# Altium integrated library Samtec 2 mm Pitch Terminal Strips.IntLib: 623 symbols (part 2 of 5) (continued)
## MTMM-112-10-L-D-420
designator P?
Modified Through-Hole Header, Vertical, -55 to 125 degC, 2 mm Pitch, 24-Pin, Male, RoHS; Manufacturer: Samtec; PartNumber: MTMM-112-10-L-D-420; Pitch: 2 mm; DatasheetVersion: F-214; PackageVersion: AE, 12/1993; PackageReference: MTMM-112-10-X-D-420; PackageDescription: 2mm Terminal Strip Assembly; Orientation: Vertical; RoHS: True; Temperature Range: -55 to 125 degC; Mounting Technology: Through-hole; ComponentLink1Description: Manufacturer URL; ComponentLink1URL: http://www.samtec.com; ComponentLink2Description: Datasheet; ComponentLink2URL: http://d2a072wq521u33.cloudfront.net/catalog_english//MTMM_TH.PDF; ComponentLink3Description: Package Specification; ComponentLink3URL: http://www.samtec.com/documents/webfiles/cpdf/MTMM-1XX-XX-XX-X-XXX-XX-XXX-MKT.pdf
footprint SMTC-MTMM-112-10-X-D-420 (Terminal Strip Assembly, 2x12 Pins, Vertical, 2mm Pitch, Male)
pins: 1, 2, 3, 4, 5, 6, 7, 8, 9, 10, 11, 12, 13, 14, 15, 16, 17, 18, 19, 20, 21, 22, 23, 24

## MTMM-112-10-T-D-420
designator P?
Modified Through-Hole Header, Vertical, -55 to 105 degC, 2 mm Pitch, 24-Pin, Male, RoHS; Manufacturer: Samtec; PartNumber: MTMM-112-10-T-D-420; Pitch: 2 mm; DatasheetVersion: F-214; PackageVersion: AE, 12/1993; PackageReference: MTMM-112-10-X-D-420; PackageDescription: 2mm Terminal Strip Assembly; Orientation: Vertical; RoHS: True; Temperature Range: -55 to 105 degC; Mounting Technology: Through-hole; ComponentLink1Description: Manufacturer URL; ComponentLink1URL: http://www.samtec.com; ComponentLink2Description: Datasheet; ComponentLink2URL: http://d2a072wq521u33.cloudfront.net/catalog_english//MTMM_TH.PDF; ComponentLink3Description: Package Specification; ComponentLink3URL: http://www.samtec.com/documents/webfiles/cpdf/MTMM-1XX-XX-XX-X-XXX-XX-XXX-MKT.pdf
footprint SMTC-MTMM-112-10-X-D-420 (Terminal Strip Assembly, 2x12 Pins, Vertical, 2mm Pitch, Male)
pins: 1, 2, 3, 4, 5, 6, 7, 8, 9, 10, 11, 12, 13, 14, 15, 16, 17, 18, 19, 20, 21, 22, 23, 24

## MTMM-113-10-F-D-420
designator P?
Modified Through-Hole Header, Vertical, -55 to 125 degC, 2 mm Pitch, 26-Pin, Male, RoHS; Manufacturer: Samtec; PartNumber: MTMM-113-10-F-D-420; Pitch: 2 mm; DatasheetVersion: F-214; PackageVersion: AE, 12/1993; PackageReference: MTMM-113-10-X-D-420; PackageDescription: 2mm Terminal Strip Assembly; Orientation: Vertical; RoHS: True; Temperature Range: -55 to 125 degC; Mounting Technology: Through-hole; ComponentLink1Description: Manufacturer URL; ComponentLink1URL: http://www.samtec.com; ComponentLink2Description: Datasheet; ComponentLink2URL: http://d2a072wq521u33.cloudfront.net/catalog_english//MTMM_TH.PDF; ComponentLink3Description: Package Specification; ComponentLink3URL: http://www.samtec.com/documents/webfiles/cpdf/MTMM-1XX-XX-XX-X-XXX-XX-XXX-MKT.pdf
footprint SMTC-MTMM-113-10-X-D-420 (Terminal Strip Assembly, 2x13 Pins, Vertical, 2mm Pitch, Male)
pins: 1, 2, 3, 4, 5, 6, 7, 8, 9, 10, 11, 12, 13, 14, 15, 16, 17, 18, 19, 20, 21, 22, 23, 24, 25, 26

## MTMM-113-10-L-D-420
designator P?
Modified Through-Hole Header, Vertical, -55 to 125 degC, 2 mm Pitch, 26-Pin, Male, RoHS; Manufacturer: Samtec; PartNumber: MTMM-113-10-L-D-420; Pitch: 2 mm; DatasheetVersion: F-214; PackageVersion: AE, 12/1993; PackageReference: MTMM-113-10-X-D-420; PackageDescription: 2mm Terminal Strip Assembly; Orientation: Vertical; RoHS: True; Temperature Range: -55 to 125 degC; Mounting Technology: Through-hole; ComponentLink1Description: Manufacturer URL; ComponentLink1URL: http://www.samtec.com; ComponentLink2Description: Datasheet; ComponentLink2URL: http://d2a072wq521u33.cloudfront.net/catalog_english//MTMM_TH.PDF; ComponentLink3Description: Package Specification; ComponentLink3URL: http://www.samtec.com/documents/webfiles/cpdf/MTMM-1XX-XX-XX-X-XXX-XX-XXX-MKT.pdf
footprint SMTC-MTMM-113-10-X-D-420 (Terminal Strip Assembly, 2x13 Pins, Vertical, 2mm Pitch, Male)
pins: 1, 2, 3, 4, 5, 6, 7, 8, 9, 10, 11, 12, 13, 14, 15, 16, 17, 18, 19, 20, 21, 22, 23, 24, 25, 26

## MTMM-113-10-T-D-420
designator P?
Modified Through-Hole Header, Vertical, -55 to 105 degC, 2 mm Pitch, 26-Pin, Male, RoHS; Manufacturer: Samtec; PartNumber: MTMM-113-10-T-D-420; Pitch: 2 mm; DatasheetVersion: F-214; PackageVersion: AE, 12/1993; PackageReference: MTMM-113-10-X-D-420; PackageDescription: 2mm Terminal Strip Assembly; Orientation: Vertical; RoHS: True; Temperature Range: -55 to 105 degC; Mounting Technology: Through-hole; ComponentLink1Description: Manufacturer URL; ComponentLink1URL: http://www.samtec.com; ComponentLink2Description: Datasheet; ComponentLink2URL: http://d2a072wq521u33.cloudfront.net/catalog_english//MTMM_TH.PDF; ComponentLink3Description: Package Specification; ComponentLink3URL: http://www.samtec.com/documents/webfiles/cpdf/MTMM-1XX-XX-XX-X-XXX-XX-XXX-MKT.pdf
footprint SMTC-MTMM-113-10-X-D-420 (Terminal Strip Assembly, 2x13 Pins, Vertical, 2mm Pitch, Male)
pins: 1, 2, 3, 4, 5, 6, 7, 8, 9, 10, 11, 12, 13, 14, 15, 16, 17, 18, 19, 20, 21, 22, 23, 24, 25, 26

## MTMM-122-07-F-D-275
designator P?
Modified Through-Hole Header, Vertical, -55 to 125 degC, 2 mm Pitch, 44-Pin, Male, RoHS; Manufacturer: Samtec; PartNumber: MTMM-122-07-F-D-275; Pitch: 2 mm; DatasheetVersion: F-214; PackageVersion: AE, 12/1993; PackageReference: MTMM-122-07-X-D-275; PackageDescription: 2mm Terminal Strip Assembly; Orientation: Vertical; RoHS: True; Temperature Range: -55 to 125 degC; Mounting Technology: Through-hole; ComponentLink1Description: Manufacturer URL; ComponentLink1URL: http://www.samtec.com; ComponentLink2Description: Datasheet; ComponentLink2URL: http://d2a072wq521u33.cloudfront.net/catalog_english//MTMM_TH.PDF; ComponentLink3Description: Package Specification; ComponentLink3URL: http://www.samtec.com/documents/webfiles/cpdf/MTMM-1XX-XX-XX-X-XXX-XX-XXX-MKT.pdf
footprint SMTC-MTMM-122-07-X-D-275 (Terminal Strip Assembly, 2x22 Pins, Vertical, 2mm Pitch, Male)
pins: 1, 2, 3, 4, 5, 6, 7, 8, 9, 10, 11, 12, 13, 14, 15, 16, 17, 18, 19, 20, 21, 22, 23, 24, 25, 26, 27, 28, 29, 30, 31, 32, 33, 34, 35, 36, 37, 38, 39, 40, 41, 42, 43, 44

## MTMM-122-07-L-D-275
designator P?
Modified Through-Hole Header, Vertical, -55 to 125 degC, 2 mm Pitch, 44-Pin, Male, RoHS; Manufacturer: Samtec; PartNumber: MTMM-122-07-L-D-275; Pitch: 2 mm; DatasheetVersion: F-214; PackageVersion: AE, 12/1993; PackageReference: MTMM-122-07-X-D-275; PackageDescription: 2mm Terminal Strip Assembly; Orientation: Vertical; RoHS: True; Temperature Range: -55 to 125 degC; Mounting Technology: Through-hole; ComponentLink1Description: Manufacturer URL; ComponentLink1URL: http://www.samtec.com; ComponentLink2Description: Datasheet; ComponentLink2URL: http://d2a072wq521u33.cloudfront.net/catalog_english//MTMM_TH.PDF; ComponentLink3Description: Package Specification; ComponentLink3URL: http://www.samtec.com/documents/webfiles/cpdf/MTMM-1XX-XX-XX-X-XXX-XX-XXX-MKT.pdf
footprint SMTC-MTMM-122-07-X-D-275 (Terminal Strip Assembly, 2x22 Pins, Vertical, 2mm Pitch, Male)
pins: 1, 2, 3, 4, 5, 6, 7, 8, 9, 10, 11, 12, 13, 14, 15, 16, 17, 18, 19, 20, 21, 22, 23, 24, 25, 26, 27, 28, 29, 30, 31, 32, 33, 34, 35, 36, 37, 38, 39, 40, 41, 42, 43, 44

## MTMM-122-07-T-D-275
designator P?
Modified Through-Hole Header, Vertical, -55 to 105 degC, 2 mm Pitch, 44-Pin, Male, RoHS; Manufacturer: Samtec; PartNumber: MTMM-122-07-T-D-275; Pitch: 2 mm; DatasheetVersion: F-214; PackageVersion: AE, 12/1993; PackageReference: MTMM-122-07-X-D-275; PackageDescription: 2mm Terminal Strip Assembly; Orientation: Vertical; RoHS: True; Temperature Range: -55 to 105 degC; Mounting Technology: Through-hole; ComponentLink1Description: Manufacturer URL; ComponentLink1URL: http://www.samtec.com; ComponentLink2Description: Datasheet; ComponentLink2URL: http://d2a072wq521u33.cloudfront.net/catalog_english//MTMM_TH.PDF; ComponentLink3Description: Package Specification; ComponentLink3URL: http://www.samtec.com/documents/webfiles/cpdf/MTMM-1XX-XX-XX-X-XXX-XX-XXX-MKT.pdf
footprint SMTC-MTMM-122-07-X-D-275 (Terminal Strip Assembly, 2x22 Pins, Vertical, 2mm Pitch, Male)
pins: 1, 2, 3, 4, 5, 6, 7, 8, 9, 10, 11, 12, 13, 14, 15, 16, 17, 18, 19, 20, 21, 22, 23, 24, 25, 26, 27, 28, 29, 30, 31, 32, 33, 34, 35, 36, 37, 38, 39, 40, 41, 42, 43, 44

## MTMM-140-04-F-D-025
designator P?
Modified Through-Hole Header, Vertical, -55 to 125 degC, 2 mm Pitch, 80-Pin, Male, RoHS; Manufacturer: Samtec; PartNumber: MTMM-140-04-F-D-025; Pitch: 2 mm; DatasheetVersion: F-214; PackageVersion: AE, 12/1993; PackageReference: MTMM-140-04-X-D-025; PackageDescription: 2mm Terminal Strip Assembly; Orientation: Vertical; RoHS: True; Temperature Range: -55 to 125 degC; Mounting Technology: Through-hole; ComponentLink1Description: Manufacturer URL; ComponentLink1URL: http://www.samtec.com; ComponentLink2Description: Datasheet; ComponentLink2URL: http://d2a072wq521u33.cloudfront.net/catalog_english//MTMM_TH.PDF; ComponentLink3Description: Package Specification; ComponentLink3URL: http://www.samtec.com/documents/webfiles/cpdf/MTMM-1XX-XX-XX-X-XXX-XX-XXX-MKT.pdf
footprint SMTC-MTMM-140-04-X-D-025 (Terminal Strip Assembly, 2x40 Pins, Vertical, 2mm Pitch, Male)
pins: 1, 2, 3, 4, 5, 6, 7, 8, 9, 10, 11, 12, 13, 14, 15, 16, 17, 18, 19, 20, 21, 22, 23, 24, 25, 26, 27, 28, 29, 30, 31, 32, 33, 34, 35, 36, 37, 38, 39, 40, 41, 42, 43, 44, 45, 46, 47, 48, 49, 50, 51, 52, 53, 54, 55, 56, 57, 58, 59, 60, 61, 62, 63, 64, 65, 66, 67, 68, 69, 70, 71, 72, 73, 74, 75, 76, 77, 78, 79, 80

## MTMM-140-04-L-D-025
designator P?
Modified Through-Hole Header, Vertical, -55 to 125 degC, 2 mm Pitch, 80-Pin, Male, RoHS; Manufacturer: Samtec; PartNumber: MTMM-140-04-L-D-025; Pitch: 2 mm; DatasheetVersion: F-214; PackageVersion: AE, 12/1993; PackageReference: MTMM-140-04-X-D-025; PackageDescription: 2mm Terminal Strip Assembly; Orientation: Vertical; RoHS: True; Temperature Range: -55 to 125 degC; Mounting Technology: Through-hole; ComponentLink1Description: Manufacturer URL; ComponentLink1URL: http://www.samtec.com; ComponentLink2Description: Datasheet; ComponentLink2URL: http://d2a072wq521u33.cloudfront.net/catalog_english//MTMM_TH.PDF; ComponentLink3Description: Package Specification; ComponentLink3URL: http://www.samtec.com/documents/webfiles/cpdf/MTMM-1XX-XX-XX-X-XXX-XX-XXX-MKT.pdf
footprint SMTC-MTMM-140-04-X-D-025 (Terminal Strip Assembly, 2x40 Pins, Vertical, 2mm Pitch, Male)
pins: 1, 2, 3, 4, 5, 6, 7, 8, 9, 10, 11, 12, 13, 14, 15, 16, 17, 18, 19, 20, 21, 22, 23, 24, 25, 26, 27, 28, 29, 30, 31, 32, 33, 34, 35, 36, 37, 38, 39, 40, 41, 42, 43, 44, 45, 46, 47, 48, 49, 50, 51, 52, 53, 54, 55, 56, 57, 58, 59, 60, 61, 62, 63, 64, 65, 66, 67, 68, 69, 70, 71, 72, 73, 74, 75, 76, 77, 78, 79, 80

## MTMM-140-04-T-D-025
designator P?
Modified Through-Hole Header, Vertical, -55 to 105 degC, 2 mm Pitch, 80-Pin, Male, RoHS; Manufacturer: Samtec; PartNumber: MTMM-140-04-T-D-025; Pitch: 2 mm; DatasheetVersion: F-214; PackageVersion: AE, 12/1993; PackageReference: MTMM-140-04-X-D-025; PackageDescription: 2mm Terminal Strip Assembly; Orientation: Vertical; RoHS: True; Temperature Range: -55 to 105 degC; Mounting Technology: Through-hole; ComponentLink1Description: Manufacturer URL; ComponentLink1URL: http://www.samtec.com; ComponentLink2Description: Datasheet; ComponentLink2URL: http://d2a072wq521u33.cloudfront.net/catalog_english//MTMM_TH.PDF; ComponentLink3Description: Package Specification; ComponentLink3URL: http://www.samtec.com/documents/webfiles/cpdf/MTMM-1XX-XX-XX-X-XXX-XX-XXX-MKT.pdf
footprint SMTC-MTMM-140-04-X-D-025 (Terminal Strip Assembly, 2x40 Pins, Vertical, 2mm Pitch, Male)
pins: 1, 2, 3, 4, 5, 6, 7, 8, 9, 10, 11, 12, 13, 14, 15, 16, 17, 18, 19, 20, 21, 22, 23, 24, 25, 26, 27, 28, 29, 30, 31, 32, 33, 34, 35, 36, 37, 38, 39, 40, 41, 42, 43, 44, 45, 46, 47, 48, 49, 50, 51, 52, 53, 54, 55, 56, 57, 58, 59, 60, 61, 62, 63, 64, 65, 66, 67, 68, 69, 70, 71, 72, 73, 74, 75, 76, 77, 78, 79, 80

## PTT-102-01-L-S
designator P?
Press Fit Header, Through-hole, Vertical, -55 to 125 degC, 2 mm Pitch, 2-Pin, Male, RoHS; Manufacturer: Samtec; PartNumber: PTT-102-01-L-S; Pitch: 2 mm; DatasheetVersion: F-214; PackageVersion: C, 1/2011; PackageReference: PTT-102-01-X-S; PackageDescription: 2 mm Press Fit Terminal Strip; Orientation: Vertical; RoHS: True; Temperature Range: -55 to 125 degC; Mounting Technology: Through-hole; ComponentLink1Description: Manufacturer URL; ComponentLink1URL: http://www.samtec.com; ComponentLink2Description: Datasheet; ComponentLink2URL: http://d2a072wq521u33.cloudfront.net/catalog_english//ptt.pdf; ComponentLink3Description: Package Specification; ComponentLink3URL: http://www.samtec.com/documents/webfiles/cpdf/PTT-1XX-01-X-S-XXX-MKT.pdf
footprint SMTC-PTT-102-01-X-S (Press Fit Terminal Strip, 1x2 Pins, Vertical, 2mm Pitch, Male)
pins: 1, 2

## PTT-103-01-L-D
designator P?
Press Fit Header, Through-hole, Vertical, -55 to 125 degC, 2 mm Pitch, 6-Pin, Male, RoHS; Manufacturer: Samtec; PartNumber: PTT-103-01-L-D; Pitch: 2 mm; DatasheetVersion: F-214; PackageVersion: E, 12/2000; PackageReference: PTT-103-01-X-D; PackageDescription: 2 mm Press Fit Terminal Strip; Orientation: Vertical; RoHS: True; Temperature Range: -55 to 125 degC; Mounting Technology: Through-hole; ComponentLink1Description: Manufacturer URL; ComponentLink1URL: http://www.samtec.com; ComponentLink2Description: Datasheet; ComponentLink2URL: http://d2a072wq521u33.cloudfront.net/catalog_english//ptt.pdf; ComponentLink3Description: Package Specification; ComponentLink3URL: http://www.samtec.com/documents/webfiles/cpdf/PTT-1XX-XX-XX-X-XXX-MKT.pdf
footprint SMTC-PTT-103-01-X-D (Press Fit Terminal Strip, 2x3 Pins, Vertical, 2mm Pitch, Male)
pins: 1, 2, 3, 4, 5, 6

## PTT-103-01-L-S
designator ?
Press Fit Header, Through-hole, Vertical, -55 to 125 degC, 2 mm Pitch, 3-Pin, Male, RoHS; Manufacturer: Samtec; PartNumber: PTT-103-01-L-S; Pitch: 2 mm; DatasheetVersion: F-214; PackageVersion: C, 1/2011; PackageReference: PTT-103-01-X-S; PackageDescription: 2 mm Press Fit Terminal Strip; Orientation: Vertical; RoHS: True; Temperature Range: -55 to 125 degC; Mounting Technology: Through-hole; ComponentLink1Description: Manufacturer URL; ComponentLink1URL: http://www.samtec.com; ComponentLink2Description: Datasheet; ComponentLink2URL: http://d2a072wq521u33.cloudfront.net/catalog_english//ptt.pdf; ComponentLink3Description: Package Specification; ComponentLink3URL: http://www.samtec.com/documents/webfiles/cpdf/PTT-1XX-01-X-S-XXX-MKT.pdf
footprint SMTC-PTT-103-01-X-S (Press Fit Terminal Strip, 1x3 Pins, Vertical, 2mm Pitch, Male)
1 alternate drawing of the same symbol

## PTT-105-01-L-D
designator P?
Press Fit Header, Through-hole, Vertical, -55 to 125 degC, 2 mm Pitch, 10-Pin, Male, RoHS; Manufacturer: Samtec; PartNumber: PTT-105-01-L-D; Pitch: 2 mm; DatasheetVersion: F-214; PackageVersion: E, 12/2000; PackageReference: PTT-105-01-X-D; PackageDescription: 2 mm Press Fit Terminal Strip; Orientation: Vertical; RoHS: True; Temperature Range: -55 to 125 degC; Mounting Technology: Through-hole; ComponentLink1Description: Manufacturer URL; ComponentLink1URL: http://www.samtec.com; ComponentLink2Description: Datasheet; ComponentLink2URL: http://d2a072wq521u33.cloudfront.net/catalog_english//ptt.pdf; ComponentLink3Description: Package Specification; ComponentLink3URL: http://www.samtec.com/documents/webfiles/cpdf/PTT-1XX-XX-XX-X-XXX-MKT.pdf
footprint SMTC-PTT-105-01-X-D (Press Fit Terminal Strip, 2x5 Pins, Vertical, 2mm Pitch, Male)
pins: 1, 2, 3, 4, 5, 6, 7, 8, 9, 10

## PTT-107-01-L-D
designator P?
Press Fit Header, Through-hole, Vertical, -55 to 125 degC, 2 mm Pitch, 14-Pin, Male, RoHS; Manufacturer: Samtec; PartNumber: PTT-107-01-L-D; Pitch: 2 mm; DatasheetVersion: F-214; PackageVersion: E, 12/2000; PackageReference: PTT-107-01-X-D; PackageDescription: 2 mm Press Fit Terminal Strip; Orientation: Vertical; RoHS: True; Temperature Range: -55 to 125 degC; Mounting Technology: Through-hole; ComponentLink1Description: Manufacturer URL; ComponentLink1URL: http://www.samtec.com; ComponentLink2Description: Datasheet; ComponentLink2URL: http://d2a072wq521u33.cloudfront.net/catalog_english//ptt.pdf; ComponentLink3Description: Package Specification; ComponentLink3URL: http://www.samtec.com/documents/webfiles/cpdf/PTT-1XX-XX-XX-X-XXX-MKT.pdf
footprint SMTC-PTT-107-01-X-D (Press Fit Terminal Strip, 2x7 Pins, Vertical, 2mm Pitch, Male)
pins: 1, 2, 3, 4, 5, 6, 7, 8, 9, 10, 11, 12, 13, 14

## PTT-115-01-L-D-021
designator P?
Press Fit Header, Through-hole, Vertical, -55 to 125 degC, 2 mm Pitch, 30-Pin, Male, RoHS; Manufacturer: Samtec; PartNumber: PTT-115-01-L-D-021; Pitch: 2 mm; DatasheetVersion: F-214; PackageVersion: E, 12/2000; PackageReference: PTT-115-01-X-D-021; PackageDescription: 2 mm Press Fit Terminal Strip; Orientation: Vertical; RoHS: True; Temperature Range: -55 to 125 degC; Mounting Technology: Through-hole; ComponentLink1Description: Manufacturer URL; ComponentLink1URL: http://www.samtec.com; ComponentLink2Description: Datasheet; ComponentLink2URL: http://d2a072wq521u33.cloudfront.net/catalog_english//ptt.pdf; ComponentLink3Description: Package Specification; ComponentLink3URL: http://www.samtec.com/documents/webfiles/cpdf/PTT-1XX-XX-XX-X-XXX-MKT.pdf
footprint SMTC-PTT-115-01-X-D-021 (Press Fit Terminal Strip, 2x15 Pins, Vertical, 2mm Pitch, Male)
pins: 1, 2, 3, 4, 5, 6, 7, 8, 9, 10, 11, 12, 13, 14, 15, 16, 17, 18, 19, 20, 21, 22, 23, 24, 25, 26, 27, 28, 29, 30

## PTT-117-01-L-D
designator P?
Press Fit Header, Through-hole, Vertical, -55 to 125 degC, 2 mm Pitch, 34-Pin, Male, RoHS; Manufacturer: Samtec; PartNumber: PTT-117-01-L-D; Pitch: 2 mm; DatasheetVersion: F-214; PackageVersion: E, 12/2000; PackageReference: PTT-117-01-X-D; PackageDescription: 2 mm Press Fit Terminal Strip; Orientation: Vertical; RoHS: True; Temperature Range: -55 to 125 degC; Mounting Technology: Through-hole; ComponentLink1Description: Manufacturer URL; ComponentLink1URL: http://www.samtec.com; ComponentLink2Description: Datasheet; ComponentLink2URL: http://d2a072wq521u33.cloudfront.net/catalog_english//ptt.pdf; ComponentLink3Description: Package Specification; ComponentLink3URL: http://www.samtec.com/documents/webfiles/cpdf/PTT-1XX-XX-XX-X-XXX-MKT.pdf
footprint SMTC-PTT-117-01-X-D (Press Fit Terminal Strip, 2x17 Pins, Vertical, 2mm Pitch, Male)
pins: 1, 2, 3, 4, 5, 6, 7, 8, 9, 10, 11, 12, 13, 14, 15, 16, 17, 18, 19, 20, 21, 22, 23, 24, 25, 26, 27, 28, 29, 30, 31, 32, 33, 34

## PTT-120-01-L-D
designator P?
Press Fit Header, Through-hole, Vertical, -55 to 125 degC, 2 mm Pitch, 40-Pin, Male, RoHS; Manufacturer: Samtec; PartNumber: PTT-120-01-L-D; Pitch: 2 mm; DatasheetVersion: F-214; PackageVersion: E, 12/2000; PackageReference: PTT-120-01-X-D; PackageDescription: 2 mm Press Fit Terminal Strip; Orientation: Vertical; RoHS: True; Temperature Range: -55 to 125 degC; Mounting Technology: Through-hole; ComponentLink1Description: Manufacturer URL; ComponentLink1URL: http://www.samtec.com; ComponentLink2Description: Datasheet; ComponentLink2URL: http://d2a072wq521u33.cloudfront.net/catalog_english//ptt.pdf; ComponentLink3Description: Package Specification; ComponentLink3URL: http://www.samtec.com/documents/webfiles/cpdf/PTT-1XX-XX-XX-X-XXX-MKT.pdf
footprint SMTC-PTT-120-01-X-D (Press Fit Terminal Strip, 2x20 Pins, Vertical, 2mm Pitch, Male)
pins: 1, 2, 3, 4, 5, 6, 7, 8, 9, 10, 11, 12, 13, 14, 15, 16, 17, 18, 19, 20, 21, 22, 23, 24, 25, 26, 27, 28, 29, 30, 31, 32, 33, 34, 35, 36, 37, 38, 39, 40

## PTT-140-01-L-D
designator ?
Press Fit Header, Through-hole, Vertical, -55 to 125 degC, 2 mm Pitch, 80-Pin, Male, RoHS; Manufacturer: Samtec; PartNumber: PTT-140-01-L-D; Pitch: 2 mm; DatasheetVersion: F-214; PackageVersion: E, 12/2000; PackageReference: PTT-140-01-X-D; PackageDescription: 2 mm Press Fit Terminal Strip; Orientation: Vertical; RoHS: True; Temperature Range: -55 to 125 degC; Mounting Technology: Through-hole; ComponentLink1Description: Manufacturer URL; ComponentLink1URL: http://www.samtec.com; ComponentLink2Description: Datasheet; ComponentLink2URL: http://d2a072wq521u33.cloudfront.net/catalog_english//ptt.pdf; ComponentLink3Description: Package Specification; ComponentLink3URL: http://www.samtec.com/documents/webfiles/cpdf/PTT-1XX-XX-XX-X-XXX-MKT.pdf
footprint SMTC-PTT-140-01-X-D (Press Fit Terminal Strip, 2x40 Pins, Vertical, 2mm Pitch, Male)
pins: 1, 2, 3, 4, 5, 6, 7, 8, 9, 10, 11, 12, 13, 14, 15, 16, 17, 18, 19, 20, 21, 22, 23, 24, 25, 26, 27, 28, 29, 30, 31, 32, 33, 34, 35, 36, 37, 38, 39, 40, 41, 42, 43, 44, 45, 46, 47, 48, 49, 50, 51, 52, 53, 54, 55, 56, 57, 58, 59, 60, 61, 62, 63, 64, 65, 66, 67, 68, 69, 70, 71, 72, 73, 74, 75, 76, 77, 78, 79, 80

## T2M-105-01-L-D-RA
designator P?
High Reliability Cable Header, Through-hole, Right Angle, -55 to 125 degC, 2 mm Pitch, 10-Pin, Male, RoHS; Manufacturer: Samtec; PartNumber: T2M-105-01-L-D-RA; Pitch: 2 mm; DatasheetVersion: F-214; PackageVersion: V, 3/2009; PackageReference: T2M-105-01-X-D-RA; PackageDescription: 2mm Shrouded Terminal Strip; Orientation: Right Angle; RoHS: True; Temperature Range: -55 to 125 degC; Mounting Technology: Through-hole; ComponentLink1Description: Manufacturer URL; ComponentLink1URL: http://www.samtec.com; ComponentLink2Description: Datasheet; ComponentLink2URL: http://d2a072wq521u33.cloudfront.net/catalog_english//t2m.pdf; ComponentLink3Description: Package Specification; ComponentLink3URL: http://www.samtec.com/documents/webfiles/cpdf/T2M-1XX-XX-X-D-XX-XX-MKT.pdf
footprint SMTC-T2M-105-01-X-D-RA (Shrouded Terminal Strip, 2x5 Pins, Right Angle, 2mm Pitch, Male)
pins: 1, 2, 3, 4, 5, 6, 7, 8, 9, 10

## T2M-105-01-L-D-RA-WT
designator P?
High Reliability Cable Header, Through-hole, Right Angle, -55 to 125 degC, 2 mm Pitch, 14-Pin, Male, RoHS; Manufacturer: Samtec; PartNumber: T2M-105-01-L-D-RA-WT; Pitch: 2 mm; DatasheetVersion: F-214; PackageVersion: V, 3/2009; PackageReference: T2M-105-01-X-D-RA-WT; PackageDescription: 2mm Shrouded Terminal Strip; Supplier 1: Newark; Supplier Part Number 1: 28T0616; Orientation: Right Angle; RoHS: True; Temperature Range: -55 to 125 degC; Mounting Technology: Through-hole; ComponentLink1Description: Manufacturer URL; ComponentLink1URL: http://www.samtec.com; ComponentLink2Description: Datasheet; ComponentLink2URL: http://d2a072wq521u33.cloudfront.net/catalog_english//t2m.pdf; ComponentLink3Description: Package Specification; ComponentLink3URL: http://www.samtec.com/documents/webfiles/cpdf/T2M-1XX-XX-X-D-XX-XX-MKT.pdf
footprint SMTC-T2M-105-01-X-D-RA-WT (Shrouded Terminal Strip, 2x5 Pins, Right Angle, 2mm Pitch, Male)
pins: 1, 2, 3, 4, 5, 6, 7, 8, 9, 10, MH1, MH2, MH3, MH4

## T2M-105-01-L-D-SM-DS
designator P?
High Reliability Cable Header, Vertical, -55 to 125 degC, 2 mm Pitch, 16-Pin, Male, RoHS; Manufacturer: Samtec; PartNumber: T2M-105-01-L-D-SM-DS; Pitch: 2 mm; DatasheetVersion: F-214; PackageVersion: V, 3/2009; PackageReference: T2M-105-01-X-D-SM-DS; PackageDescription: 2mm Shrouded Terminal Strip; Orientation: Vertical; RoHS: True; Temperature Range: -55 to 125 degC; ComponentLink1Description: Manufacturer URL; ComponentLink1URL: http://www.samtec.com; ComponentLink2Description: Datasheet; ComponentLink2URL: http://d2a072wq521u33.cloudfront.net/catalog_english//t2m.pdf; ComponentLink3Description: Package Specification; ComponentLink3URL: http://www.samtec.com/documents/webfiles/cpdf/T2M-1XX-XX-X-D-XX-XX-MKT.pdf
footprint SMTC-T2M-105-01-X-D-SM-DS (Shrouded Terminal Strip, 2x5 Pins, Vertical, 2mm Pitch, Male)
pins: 1, 2, 3, 4, 5, 6, 7, 8, 9, 10, MH1, MH2, MH3, MH4, MH5, MH6

## T2M-105-01-L-D-SM-WT
designator P?
High Reliability Cable Header, Vertical, -55 to 125 degC, 2 mm Pitch, 12-Pin, Male, RoHS; Manufacturer: Samtec; PartNumber: T2M-105-01-L-D-SM-WT; Pitch: 2 mm; DatasheetVersion: F-214; PackageVersion: V, 3/2009; PackageReference: T2M-105-01-X-D-SM-WT; PackageDescription: 2mm Shrouded Terminal Strip; Orientation: Vertical; RoHS: True; Temperature Range: -55 to 125 degC; ComponentLink1Description: Manufacturer URL; ComponentLink1URL: http://www.samtec.com; ComponentLink2Description: Datasheet; ComponentLink2URL: http://d2a072wq521u33.cloudfront.net/catalog_english//t2m.pdf; ComponentLink3Description: Package Specification; ComponentLink3URL: http://www.samtec.com/documents/webfiles/cpdf/T2M-1XX-XX-X-D-XX-XX-MKT.pdf
footprint SMTC-T2M-105-01-X-D-SM-WT (Shrouded Terminal Strip, 2x5 Pins, Vertical, 2mm Pitch, Male)
pins: 1, 2, 3, 4, 5, 6, 7, 8, 9, 10, MH1, MH2

## T2M-105-01-L-D-TH
designator P?
High Reliability Cable Header, Through-hole, Vertical, -55 to 125 degC, 2 mm Pitch, 10-Pin, Male, RoHS; Manufacturer: Samtec; PartNumber: T2M-105-01-L-D-TH; Pitch: 2 mm; DatasheetVersion: F-214; PackageVersion: V, 3/2009; PackageReference: T2M-105-01-X-D-TH; PackageDescription: 2mm Shrouded Terminal Strip; Orientation: Vertical; RoHS: True; Temperature Range: -55 to 125 degC; Mounting Technology: Through-hole; ComponentLink1Description: Manufacturer URL; ComponentLink1URL: http://www.samtec.com; ComponentLink2Description: Datasheet; ComponentLink2URL: http://d2a072wq521u33.cloudfront.net/catalog_english//t2m.pdf; ComponentLink3Description: Package Specification; ComponentLink3URL: http://www.samtec.com/documents/webfiles/cpdf/T2M-1XX-XX-X-D-XX-XX-MKT.pdf
footprint SMTC-T2M-105-01-X-D-TH (Shrouded Terminal Strip, 2x5 Pins, Vertical, 2mm Pitch, Male)
pins: 1, 2, 3, 4, 5, 6, 7, 8, 9, 10

## T2M-105-01-L-D-TH-DS
designator P?
High Reliability Cable Header, Through-hole, Vertical, -55 to 125 degC, 2 mm Pitch, 16-Pin, Male, RoHS; Manufacturer: Samtec; PartNumber: T2M-105-01-L-D-TH-DS; Pitch: 2 mm; DatasheetVersion: F-214; PackageVersion: V, 3/2009; PackageReference: T2M-105-01-X-D-TH-DS; PackageDescription: 2mm Shrouded Terminal Strip; Orientation: Vertical; RoHS: True; Temperature Range: -55 to 125 degC; Mounting Technology: Through-hole; ComponentLink1Description: Manufacturer URL; ComponentLink1URL: http://www.samtec.com; ComponentLink2Description: Datasheet; ComponentLink2URL: http://d2a072wq521u33.cloudfront.net/catalog_english//t2m.pdf; ComponentLink3Description: Package Specification; ComponentLink3URL: http://www.samtec.com/documents/webfiles/cpdf/T2M-1XX-XX-X-D-XX-XX-MKT.pdf
footprint SMTC-T2M-105-01-X-D-TH-DS (Shrouded Terminal Strip, 2x5 Pins, Vertical, 2mm Pitch, Male)
pins: 1, 2, 3, 4, 5, 6, 7, 8, 9, 10, MH1, MH2, MH3, MH4, MH5, MH6

## T2M-105-01-L-D-TH-WT
designator P?
High Reliability Cable Header, Through-hole, Vertical, -55 to 125 degC, 2 mm Pitch, 12-Pin, Male, RoHS; Manufacturer: Samtec; PartNumber: T2M-105-01-L-D-TH-WT; Pitch: 2 mm; DatasheetVersion: F-214; PackageVersion: V, 3/2009; PackageReference: T2M-105-01-X-D-TH-WT; PackageDescription: 2mm Shrouded Terminal Strip; Supplier 1: Newark; Supplier Part Number 1: 64T5334; Orientation: Vertical; RoHS: True; Temperature Range: -55 to 125 degC; Mounting Technology: Through-hole; ComponentLink1Description: Manufacturer URL; ComponentLink1URL: http://www.samtec.com; ComponentLink2Description: Datasheet; ComponentLink2URL: http://d2a072wq521u33.cloudfront.net/catalog_english//t2m.pdf; ComponentLink3Description: Package Specification; ComponentLink3URL: http://www.samtec.com/documents/webfiles/cpdf/T2M-1XX-XX-X-D-XX-XX-MKT.pdf
footprint SMTC-T2M-105-01-X-D-TH-WT (Shrouded Terminal Strip, 2x5 Pins, Vertical, 2mm Pitch, Male)
pins: 1, 2, 3, 4, 5, 6, 7, 8, 9, 10, MH1, MH2

## T2M-106-01-L-D-SM-DS
designator P?
High Reliability Cable Header, Vertical, -55 to 125 degC, 2 mm Pitch, 18-Pin, Male, RoHS; Manufacturer: Samtec; PartNumber: T2M-106-01-L-D-SM-DS; Pitch: 2 mm; DatasheetVersion: F-214; PackageVersion: V, 3/2009; PackageReference: T2M-106-01-X-D-SM-DS; PackageDescription: 2mm Shrouded Terminal Strip; Orientation: Vertical; RoHS: True; Temperature Range: -55 to 125 degC; ComponentLink1Description: Manufacturer URL; ComponentLink1URL: http://www.samtec.com; ComponentLink2Description: Datasheet; ComponentLink2URL: http://d2a072wq521u33.cloudfront.net/catalog_english//t2m.pdf; ComponentLink3Description: Package Specification; ComponentLink3URL: http://www.samtec.com/documents/webfiles/cpdf/T2M-1XX-XX-X-D-XX-XX-MKT.pdf
footprint SMTC-T2M-106-01-X-D-SM-DS (Shrouded Terminal Strip, 2x6 Pins, Vertical, 2mm Pitch, Male)
pins: 1, 2, 3, 4, 5, 6, 7, 8, 9, 10, 11, 12, MH1, MH2, MH3, MH4, MH5, MH6

## T2M-107-01-L-D-RA
designator P?
High Reliability Cable Header, Through-hole, Right Angle, -55 to 125 degC, 2 mm Pitch, 14-Pin, Male, RoHS; Manufacturer: Samtec; PartNumber: T2M-107-01-L-D-RA; Pitch: 2 mm; DatasheetVersion: F-214; PackageVersion: V, 3/2009; PackageReference: T2M-107-01-X-D-RA; PackageDescription: 2mm Shrouded Terminal Strip; Supplier 1: Newark; Supplier Part Number 1: 44W9208; Orientation: Right Angle; RoHS: True; Temperature Range: -55 to 125 degC; Mounting Technology: Through-hole; ComponentLink1Description: Manufacturer URL; ComponentLink1URL: http://www.samtec.com; ComponentLink2Description: Datasheet; ComponentLink2URL: http://d2a072wq521u33.cloudfront.net/catalog_english//t2m.pdf; ComponentLink3Description: Package Specification; ComponentLink3URL: http://www.samtec.com/documents/webfiles/cpdf/T2M-1XX-XX-X-D-XX-XX-MKT.pdf
footprint SMTC-T2M-107-01-X-D-RA (Shrouded Terminal Strip, 2x7 Pins, Right Angle, 2mm Pitch, Male)
pins: 1, 2, 3, 4, 5, 6, 7, 8, 9, 10, 11, 12, 13, 14

## T2M-107-01-L-D-RA-WT
designator P?
High Reliability Cable Header, Through-hole, Right Angle, -55 to 125 degC, 2 mm Pitch, 18-Pin, Male, RoHS; Manufacturer: Samtec; PartNumber: T2M-107-01-L-D-RA-WT; Pitch: 2 mm; DatasheetVersion: F-214; PackageVersion: V, 3/2009; PackageReference: T2M-107-01-X-D-RA-WT; PackageDescription: 2mm Shrouded Terminal Strip; Supplier 1: Newark; Supplier Part Number 1: 28T0612; Orientation: Right Angle; RoHS: True; Temperature Range: -55 to 125 degC; Mounting Technology: Through-hole; ComponentLink1Description: Manufacturer URL; ComponentLink1URL: http://www.samtec.com; ComponentLink2Description: Datasheet; ComponentLink2URL: http://d2a072wq521u33.cloudfront.net/catalog_english//t2m.pdf; ComponentLink3Description: Package Specification; ComponentLink3URL: http://www.samtec.com/documents/webfiles/cpdf/T2M-1XX-XX-X-D-XX-XX-MKT.pdf
footprint SMTC-T2M-107-01-X-D-RA-WT (Shrouded Terminal Strip, 2x7 Pins, Right Angle, 2mm Pitch, Male)
pins: 1, 2, 3, 4, 5, 6, 7, 8, 9, 10, 11, 12, 13, 14, MH1, MH2, MH3, MH4

## T2M-107-01-L-D-SM
designator P?
High Reliability Cable Header, Surface Mount, Vertical, -55 to 125 degC, 2 mm Pitch, 14-Pin, Male, RoHS; Manufacturer: Samtec; PartNumber: T2M-107-01-L-D-SM; Pitch: 2 mm; DatasheetVersion: F-214; PackageVersion: V, 3/2009; PackageReference: T2M-107-01-X-D-SM; PackageDescription: 2mm Shrouded Terminal Strip; Orientation: Vertical; RoHS: True; Temperature Range: -55 to 125 degC; Mounting Technology: Surface Mount; ComponentLink1Description: Manufacturer URL; ComponentLink1URL: http://www.samtec.com; ComponentLink2Description: Datasheet; ComponentLink2URL: http://d2a072wq521u33.cloudfront.net/catalog_english//t2m.pdf; ComponentLink3Description: Package Specification; ComponentLink3URL: http://www.samtec.com/documents/webfiles/cpdf/T2M-1XX-XX-X-D-XX-XX-MKT.pdf
footprint SMTC-T2M-107-01-X-D-SM (Shrouded Terminal Strip, 2x7 Pins, Vertical, 2mm Pitch, Male)
pins: 1, 2, 3, 4, 5, 6, 7, 8, 9, 10, 11, 12, 13, 14

## T2M-107-01-L-D-SM-DS
designator P?
High Reliability Cable Header, Vertical, -55 to 125 degC, 2 mm Pitch, 14-Pin, Male, RoHS; Manufacturer: Samtec; PartNumber: T2M-107-01-L-D-SM-DS; Pitch: 2 mm; DatasheetVersion: F-214; PackageVersion: V, 3/2009; PackageReference: T2M-107-01-X-D-SM-DS; PackageDescription: 2mm Shrouded Terminal Strip; Orientation: Vertical; RoHS: True; Temperature Range: -55 to 125 degC; ComponentLink1Description: Manufacturer URL; ComponentLink1URL: http://www.samtec.com; ComponentLink2Description: Datasheet; ComponentLink2URL: http://d2a072wq521u33.cloudfront.net/catalog_english//t2m.pdf; ComponentLink3Description: Package Specification; ComponentLink3URL: http://www.samtec.com/documents/webfiles/cpdf/T2M-1XX-XX-X-D-XX-XX-MKT.pdf
footprint SMTC-T2M-107-01-X-D-SM-DS (Shrouded Terminal Strip, 2x7 Pins, Vertical, 2mm Pitch, Male)
pins: 1, 2, 3, 4, 5, 6, 7, 8, 9, 10, 11, 12, 13, 14, MH1, MH2, MH3, MH4, MH5, MH6

## T2M-107-01-L-D-SM-WT
designator P?
High Reliability Cable Header, Vertical, -55 to 125 degC, 2 mm Pitch, 16-Pin, Male, RoHS; Manufacturer: Samtec; PartNumber: T2M-107-01-L-D-SM-WT; Pitch: 2 mm; DatasheetVersion: F-214; PackageVersion: V, 3/2009; PackageReference: T2M-107-01-X-D-SM-WT; PackageDescription: 2mm Shrouded Terminal Strip; Supplier 1: Newark; Supplier Part Number 1: 43T4682; Orientation: Vertical; RoHS: True; Temperature Range: -55 to 125 degC; ComponentLink1Description: Manufacturer URL; ComponentLink1URL: http://www.samtec.com; ComponentLink2Description: Datasheet; ComponentLink2URL: http://d2a072wq521u33.cloudfront.net/catalog_english//t2m.pdf; ComponentLink3Description: Package Specification; ComponentLink3URL: http://www.samtec.com/documents/webfiles/cpdf/T2M-1XX-XX-X-D-XX-XX-MKT.pdf
footprint SMTC-T2M-107-01-X-D-SM-WT (Shrouded Terminal Strip, 2x7 Pins, Vertical, 2mm Pitch, Male)
pins: 1, 2, 3, 4, 5, 6, 7, 8, 9, 10, 11, 12, 13, 14, MH1, MH2

## T2M-107-01-L-D-SM-WT-K
designator P?
High Reliability Cable Header, Vertical, -55 to 125 degC, 2 mm Pitch, 16-Pin, Male, RoHS; Manufacturer: Samtec; PartNumber: T2M-107-01-L-D-SM-WT-K; Pitch: 2 mm; DatasheetVersion: F-214; PackageVersion: V, 3/2009; PackageReference: T2M-107-01-X-D-SM-WT-K; PackageDescription: 2mm Shrouded Terminal Strip; Orientation: Vertical; RoHS: True; Temperature Range: -55 to 125 degC; ComponentLink1Description: Manufacturer URL; ComponentLink1URL: http://www.samtec.com; ComponentLink2Description: Datasheet; ComponentLink2URL: http://d2a072wq521u33.cloudfront.net/catalog_english//t2m.pdf; ComponentLink3Description: Package Specification; ComponentLink3URL: http://www.samtec.com/documents/webfiles/cpdf/T2M-1XX-XX-X-D-XX-XX-MKT.pdf
footprint SMTC-T2M-107-01-X-D-SM-WT-K (Shrouded Terminal Strip, 2x7 Pins, Vertical, 2mm Pitch, Male)
pins: 1, 2, 3, 4, 5, 6, 7, 8, 9, 10, 11, 12, 13, 14, MH1, MH2

## T2M-107-01-L-D-TH
designator P?
High Reliability Cable Header, Through-hole, Vertical, -55 to 125 degC, 2 mm Pitch, 14-Pin, Male, RoHS; Manufacturer: Samtec; PartNumber: T2M-107-01-L-D-TH; Pitch: 2 mm; DatasheetVersion: F-214; PackageVersion: V, 3/2009; PackageReference: T2M-107-01-X-D-TH; PackageDescription: 2mm Shrouded Terminal Strip; Orientation: Vertical; RoHS: True; Temperature Range: -55 to 125 degC; Mounting Technology: Through-hole; ComponentLink1Description: Manufacturer URL; ComponentLink1URL: http://www.samtec.com; ComponentLink2Description: Datasheet; ComponentLink2URL: http://d2a072wq521u33.cloudfront.net/catalog_english//t2m.pdf; ComponentLink3Description: Package Specification; ComponentLink3URL: http://www.samtec.com/documents/webfiles/cpdf/T2M-1XX-XX-X-D-XX-XX-MKT.pdf
footprint SMTC-T2M-107-01-X-D-TH (Shrouded Terminal Strip, 2x7 Pins, Vertical, 2mm Pitch, Male)
pins: 1, 2, 3, 4, 5, 6, 7, 8, 9, 10, 11, 12, 13, 14

## T2M-107-01-L-D-TH-DS
designator P?
High Reliability Cable Header, Through-hole, Vertical, -55 to 125 degC, 2 mm Pitch, 14-Pin, Male, RoHS; Manufacturer: Samtec; PartNumber: T2M-107-01-L-D-TH-DS; Pitch: 2 mm; DatasheetVersion: F-214; PackageVersion: V, 3/2009; PackageReference: T2M-107-01-X-D-TH-DS; PackageDescription: 2mm Shrouded Terminal Strip; Orientation: Vertical; RoHS: True; Temperature Range: -55 to 125 degC; Mounting Technology: Through-hole; ComponentLink1Description: Manufacturer URL; ComponentLink1URL: http://www.samtec.com; ComponentLink2Description: Datasheet; ComponentLink2URL: http://d2a072wq521u33.cloudfront.net/catalog_english//t2m.pdf; ComponentLink3Description: Package Specification; ComponentLink3URL: http://www.samtec.com/documents/webfiles/cpdf/T2M-1XX-XX-X-D-XX-XX-MKT.pdf
footprint SMTC-T2M-107-01-X-D-TH-DS (Shrouded Terminal Strip, 2x7 Pins, Vertical, 2mm Pitch, Male)
pins: 1, 2, 3, 4, 5, 6, 7, 8, 9, 10, 11, 12, 13, 14, MH1, MH2, MH3, MH4, MH5, MH6

## T2M-107-01-L-D-TH-WT
designator P?
High Reliability Cable Header, Through-hole, Vertical, -55 to 125 degC, 2 mm Pitch, 16-Pin, Male, RoHS; Manufacturer: Samtec; PartNumber: T2M-107-01-L-D-TH-WT; Pitch: 2 mm; DatasheetVersion: F-214; PackageVersion: V, 3/2009; PackageReference: T2M-107-01-X-D-TH-WT; PackageDescription: 2mm Shrouded Terminal Strip; Orientation: Vertical; RoHS: True; Temperature Range: -55 to 125 degC; Mounting Technology: Through-hole; ComponentLink1Description: Manufacturer URL; ComponentLink1URL: http://www.samtec.com; ComponentLink2Description: Datasheet; ComponentLink2URL: http://d2a072wq521u33.cloudfront.net/catalog_english//t2m.pdf; ComponentLink3Description: Package Specification; ComponentLink3URL: http://www.samtec.com/documents/webfiles/cpdf/T2M-1XX-XX-X-D-XX-XX-MKT.pdf
footprint SMTC-T2M-107-01-X-D-TH-WT (Shrouded Terminal Strip, 2x7 Pins, Vertical, 2mm Pitch, Male)
pins: 1, 2, 3, 4, 5, 6, 7, 8, 9, 10, 11, 12, 13, 14, MH1, MH2
